# Altium footprint library Basal.PcbLib: 248 footprints (part 7 of 16)
Each footprint in its own frame and in the unit in brackets; x right, y up, seen from the top. Pads: shape width x height; smd on the part's side, far side on the other; paste and mask are expansions set on the pad; w line width, h text height; cw(c..) or ccw(c..) is an arc to the next point about the centre after c.
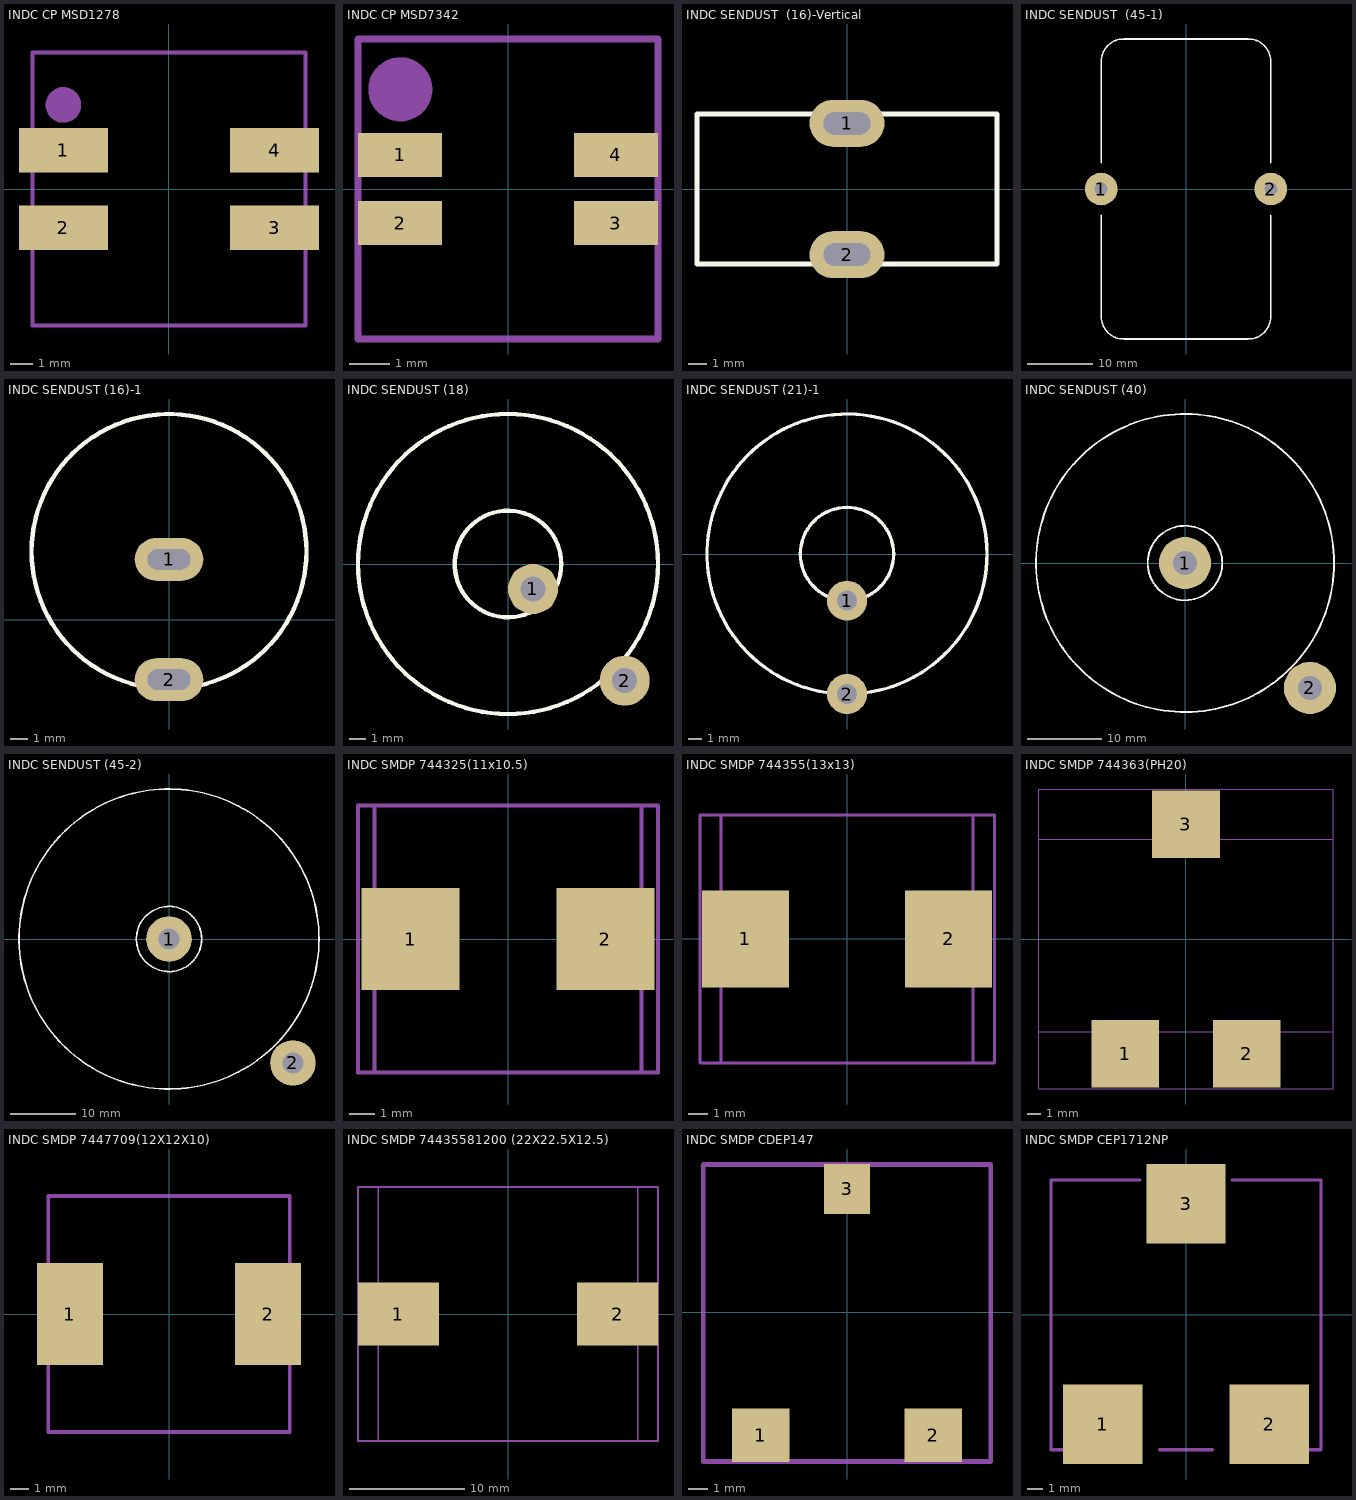
[diagram p6: the footprints below, top view; thin cyan lines are the x and y axes]

## INDC CP MSD1278 [mm] "12*12*8共模电感"
pads (4):
  rect 4x2 smd: 1(-4.75,1.75) 2(-4.75,-1.75) 3(4.75,-1.75) 4(4.75,1.75)
Mechanical 15:
  circle w0.8: c-4.75,3.785 r0.4
  lines w0.178: -6.15,-6.15 6.15,-6.15 6.15,6.15 -6.15,6.15 -6.15,-6.15
3D body "Coilcraft-MSD1278-DEFAULT.STEP": height 8.1, standoff 0.05, extent -6.1,-6.1 6.1,6.1

## INDC CP MSD7342 [mm] "7.5*7.5*4.6共模电感"
pads (4):
  rect 2.1x1.1 smd: 1(-2.7,0.85) 2(-2.7,-0.85) 3(2.7,-0.85) 4(2.7,0.85)
Mechanical 15:
  circle w0.8: c-2.692,2.492 r0.4
  lines w0.178: -3.75,-3.75 -3.75,3.75 3.75,3.75 3.75,-3.75 -3.75,-3.75
3D body "Coilcraft-MSD7342-DEFAULT.STEP": height 4.65, standoff 0.05, extent -3.725,-3.725 3.725,3.725

## INDC SENDUST  (16)-Vertical [mm]
pads (2):
  oval 4x2.5 hole 1.2 slot 2.5 at 0 deg: 1(0,3.5) 2(0,-3.5)
Top Overlay:
  lines w0.254: -8.001,-4 8.001,-4 8.001,4 -8.001,4 -8.001,-4
3D body: height 10.5, standoff 5.5, extent -2.489,-4.051 2.511,4.049
3D body: height 16, standoff 0, extent -8,-3.999 8,4.001

## INDC SENDUST  (45-1) [mm]
pads (2):
  round 5 hole 2: 1(-13,0) 2(13,0)
Top Overlay:
  lines w0.254: -13,-4 -13,-19.558 ccw(c-9.558,-19.558) -9.558,-23 -9.495,-23 9.558,-23 ccw(c9.558,-19.558) 13,-19.558 13,-4 ; -13,4 -13,19.558 cw(c-9.558,19.558) -9.558,23 9.558,23 cw(c9.558,19.558) 13,19.558 13,4

## INDC SENDUST (16)-1 [mm]
pads (2):
  oval 4x2.5 hole 1.2 slot 2.5 at 0 deg: 1(0,3.5) 2(0,-3.5)
Top Overlay:
  circle w0.254: c0,3.962 r8
3D body: height 8, standoff 0, extent -8,-3.997 8,11.998
3D body: height 8.1, standoff 0, extent -2.489,1.55 2.511,6.548

## INDC SENDUST (18) [mm]
pads (2):
  round 3 hole 1.5: 1(1.5,-1.5) 2(7,-7)
Top Overlay:
  circle w0.254: c0,0 r9
  circle w0.254: c0,0 r3.2
3D body: height 9, standoff 0, extent -9,-8.997 9,8.998
3D body: height 9.01, standoff 0.01, extent -3.2,-3.199 3.2,3.199

## INDC SENDUST (21)-1 [mm]
pads (2):
  round 3 hole 1.5: 1(0,-3.5) 2(0,-10.5)
Top Overlay:
  circle w0.254: c0,0 r10.5
  circle w0.254: c0,0 r3.5
3D body: height 9, standoff 0, extent -10.5,-10.497 10.5,10.497
3D body: height 9.01, standoff 0.01, extent -3.5,-3.499 3.5,3.499

## INDC SENDUST (40) [mm]
pads (2):
  round 7 hole 3.2: 1(0,0) 2(16.764,-16.764)
Top Overlay:
  circle w0.254: c0,0 r20
  circle w0.254: c0,0 r5
3D body: height 17, standoff 0, extent -20,-19.994 20,19.995
3D body: height 17.1, standoff 4, extent -7,-6.998 7,6.998

## INDC SENDUST (45-2) [mm]
pads (2):
  round 7 hole 3.2: 1(0,0) 2(19,-19)
Top Overlay:
  circle w0.254: c0,0 r5
  circle w0.254: c0,0 r23
3D body: height 22.5, standoff 0.1, extent -17.526,-17.653 -2.032,-2.159
3D body: height 22.5, standoff 0.1, extent -17.59,2.095 -2.095,17.59
3D body: height 22.5, standoff 0.1, extent 2.095,2.095 17.59,17.59
3D body: height 22.5, standoff 0.1, extent 2.159,-17.653 17.653,-2.159
3D body: height 22.5, standoff 0.1, extent -2.032,-22.924 2.032,-5.08
3D body: height 22.5, standoff 0.1, extent -2.032,5.048 2.032,22.892
3D body: height 22.5, standoff 0.1, extent -22.796,-2.032 -4.953,2.032
3D body: height 18.4, standoff 3.9, extent -7,-6.998 7,6.998
3D body: height 18, standoff 4, extent -20,-19.994 20,19.995
3D body: height 22.5, standoff 0.1, extent 5.08,-2.032 22.924,2.032

## INDC SMDP 744325(11x10.5) [mm]
pads (2):
  rect 3.85x4 smd: 1(-3.83,0) 2(3.83,0)
Mechanical 15:
  lines w0.152: -5.25,-5.25 -5.25,5.25 ; 5.25,-5.25 5.25,5.25 ; -5.9,-5.25 -5.9,5.25 5.9,5.25 5.9,-5.25 -5.9,-5.25
3D body: height 4.72, standoff -0.09, extent -5.5,-5.256 5.5,5.256

## INDC SMDP 744355(13x13) [mm]
pads (2):
  rect 4.5x5 smd: 1(-5.25,0) 2(5.25,0)
Mechanical 15:
  lines w0.152: -6.5,-6.4 -6.5,6.4 ; 6.5,-6.4 6.5,6.4 ; -7.595,-6.4 -7.595,6.4 7.62,6.4 7.62,-6.4 -7.595,-6.4
3D body "744355047.STEP": height 4.72, standoff -0.09, extent -6.5,-6.4 6.5,6.4

## INDC SMDP 744363(PH20) [mm] "Wurth大电流电感20 x 20 x 14.5"
height 15
pads (3):
  rect 5x5 smd: 1(-4.5,-8.5) 2(4.5,-8.5) 3(0,8.5)
Mechanical 15:
  lines w0.076: -10.9,-6.858 10.9,-6.858 ; -10.897,7.366 10.903,7.366 ; -10.9,-11.1 -10.9,11.1 10.9,11.1 10.9,-11.1 -10.9,-11.1
3D body "STEP-WE-HCF-2013-rev1.stp": height 14, standoff 0, extent -10.75,-10.346 10.75,10.654

## INDC SMDP 7447709(12X12X10) [mm]
pads (2):
  rect 3.5x5.4 smd: 1(-5.25,0) 2(5.25,0)
Mechanical 15:
  lines w0.203: -6.4,-6.25 -6.4,6.25 6.4,6.25 6.4,-6.25 -6.4,-6.25
3D body "Inductor SRR1280 Series.STEP": height 7.51, standoff 0, extent -6.275,-6.224 6.225,6.276

## INDC SMDP 74435581200 (22X22.5X12.5) [mm]
pads (2):
  rect 7x5.5 smd: 1(-9.5,0) 2(9.5,0)
Mechanical 15:
  lines w0.152: -11.25,-11 -11.25,11 ; 11.25,-11 11.25,11 ; -13,-11 -13,11 13,11 13,-11 -13,-11
3D body: height 12.13, standoff 0, extent -11.75,-11 11.75,11

## INDC SMDP CDEP147 [mm] "扁铜线电感14.9*14.9*8.0mm"
height 8
pads (3):
  rect 3x2.8 smd: 1(-4.5,-6.425) 2(4.5,-6.425)
  rect 2.4x2.6 smd: 3(0,6.425)
Mechanical 15:
  lines w0.254: -7.5,-7.798 -7.5,7.696 7.5,7.696 7.5,-7.798 -7.5,-7.798
3D body "User Library-Sumida 147.STEP": height 8, standoff 0, extent -7.25,-7.325 7.25,7.175

## INDC SMDP CEP1712NP [mm] "SUMIDA-CEP1712NP"
pads (3):
  rect 5x5 smd: 1(-5.25,-6.903) 2(5.25,-6.903) 3(0,7.005)
Mechanical 15:
  lines w0.203: -7.366,-8.5 -8.5,-8.5 -8.5,8.5 -2.921,8.5 ; -1.651,-8.5 1.651,-8.5 ; 2.921,8.5 8.5,8.5 8.5,-8.5 7.366,-8.5
3D body: height 4, standoff 0, extent 3.969,-9.144 6.531,-8.255
3D body: height 4, standoff 3, extent 3.969,-8.255 6.531,-4.496
3D body: height 12, standoff 0, extent 6.807,-4.5 8.5,8.255
3D body: height 10.3, standoff 9.3, extent -6.5,-6.498 6.5,6.498
3D body: height 9, standoff 8, extent -6.5,-6.498 6.5,6.498
3D body: height 7.7, standoff 6.7, extent -6.5,-6.498 6.5,6.498
3D body: height 6.5, standoff 5.5, extent -6.5,-6.498 6.5,6.498
3D body: height 5.2, standoff 4.2, extent -6.5,-6.498 6.5,6.498
3D body: height 4, standoff 3, extent -6.5,-6.498 6.5,6.498
3D body: height 4, standoff 0, extent -1.281,8.255 1.281,9.144
3D body: height 4, standoff 3, extent -1.281,5.08 1.281,8.255
3D body: height 10.3, standoff 0, extent 3.969,-5.347 6.531,-4.458
3D body: height 10.3, standoff 9.3, extent 3.969,-5.359 6.531,-1.702
3D body: height 4, standoff 3, extent -6.531,-8.255 -3.969,-1.168
3D body: height 4, standoff 0, extent -6.531,-9.144 -3.969,-8.255
3D body: height 12, standoff 0, extent -8.5,-4.5 -6.807,8.255
3D body: height 3, standoff 0, extent -8.5,-8.5 8.5,8.5
3D body: height 12, standoff 10.5, extent -8.5,-4.5 8.5,8.255
3D body: height 12, standoff 1, extent -4,-3.998 4,3.999